# Altium footprint library capacitor_thd.PcbLib: 131 footprints (part 8 of 9)
Each footprint in its own frame and in the unit in brackets; x right, y up, seen from the top. Pads: shape width x height; smd on the part's side, far side on the other; paste and mask are expansions set on the pad; w line width, h text height; cw(c..) or ccw(c..) is an arc to the next point about the centre after c.
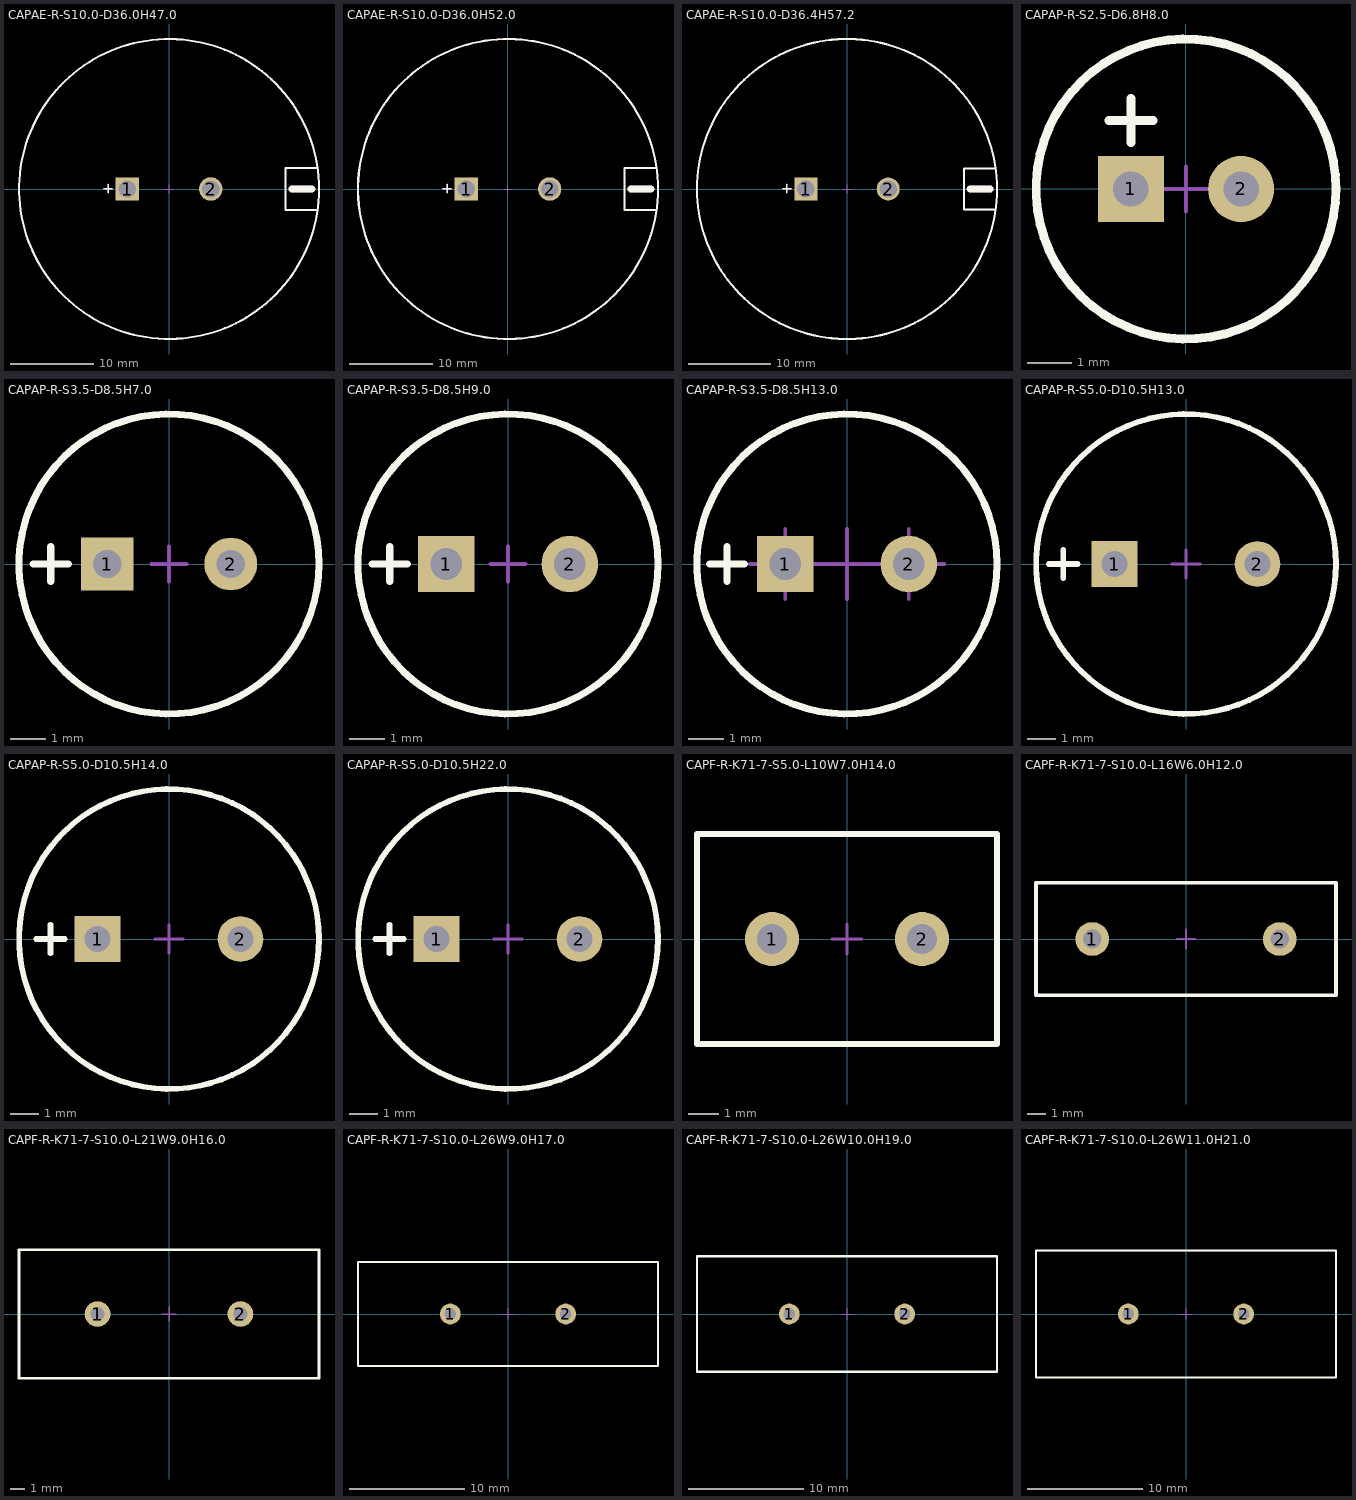
[diagram p7: the footprints below, top view; thin cyan lines are the x and y axes]

## CAPAE-R-S10.0-D36.0H47.0 [mm] "Capacitor, Radial, Leads spacing 10mm - Body Diameter 36.0mm X Body  Height 47.0mm"
height 47
pads (2):
  rect 2.8x2.8 hole 2.1: 1(-5,0)
  round 2.8 hole 2.1: 2(5,0)
Top Overlay:
  circle w0.254: c0,0 r18
  lines w0.2: -7.8,0.05 -6.8,0.05 ; -7.3,-0.45 -7.3,0.55
  lines w0.254: 17.75,-2.5 14,-2.5 14,2.5 17.75,2.5
  lines w0.8: 14.725,0 17.159,0
Mechanical 1:
  circle w0.1: c0,0 r18
  lines w0.1: -7.8,0.05 -6.8,0.05 ; -7.3,-0.45 -7.3,0.55 ; 17.75,-2.5 14,-2.5 14,2.5 17.75,2.5
  lines w0.8: 14.725,0 17.159,0
Mechanical 15:
  circle w0.1: c-0.01,0 r18
  lines w0.1: -0.5,0 0.5,0 ; 0,-0.5 0,0.5
3D body "CAPPR1000-3600X4700.stp": height 47, standoff -4, extent -18,-17.995 17.997,17.996

## CAPAE-R-S10.0-D36.0H52.0 [mm] "Capacitor, Radial, Leads spacing 10mm - Body Diameter 36.0mm X Body  Height 52.0mm"
height 52
pads (2):
  rect 2.8x2.8 hole 2.1: 1(-5,0)
  round 2.8 hole 2.1: 2(5,0)
Top Overlay:
  circle w0.254: c0,0 r18
  lines w0.2: -7.8,0.05 -6.8,0.05 ; -7.3,-0.45 -7.3,0.55
  lines w0.254: 17.75,-2.5 14,-2.5 14,2.5 17.75,2.5
  lines w0.8: 14.725,0 17.159,0
Mechanical 1:
  circle w0.1: c0,0 r18
  lines w0.1: -7.8,0.05 -6.8,0.05 ; -7.3,-0.45 -7.3,0.55 ; 17.75,-2.5 14,-2.5 14,2.5 17.75,2.5
  lines w0.8: 14.725,0 17.159,0
Mechanical 15:
  circle w0.1: c0,0 r18
  lines w0.1: -0.5,0 0.5,0 ; 0,-0.5 0,0.5
3D body "CAPPR1000-3600X5200.stp": height 52, standoff -4, extent -18,-17.958 18,17.958

## CAPAE-R-S10.0-D36.4H57.2 [mm] "Capacitor, Radial, Leads spacing 10mm - Body Diameter 36.4mm X Body  Height 57.2mm"
height 57.2
pads (2):
  rect 2.8x2.8 hole 2.1: 1(-5,0)
  round 2.8 hole 2.1: 2(5,0)
Top Overlay:
  circle w0.254: c0,0 r18.2
  lines w0.2: -7.8,0.05 -6.8,0.05 ; -7.3,-0.45 -7.3,0.55
  lines w0.254: 17.95,-2.5 14.2,-2.5 14.2,2.5 17.95,2.5
  lines w0.8: 14.925,0 17.359,0
Mechanical 1:
  circle w0.1: c0,0 r18.2
  lines w0.1: -7.8,0.05 -6.8,0.05 ; -7.3,-0.45 -7.3,0.55 ; 17.95,-2.5 14.2,-2.5 14.2,2.5 17.95,2.5
  lines w0.8: 14.925,0 17.359,0
Mechanical 15:
  circle w0.1: c0,0 r18.2
  lines w0.1: -0.5,0 0.5,0 ; 0,-0.5 0,0.5
3D body "CAPPR1000-3640X5720.stp": height 57.2, standoff -4, extent -18.2,-18.199 18.197,18.199

## CAPAP-R-S2.5-D6.8H8.0 [mm] "Capacitor, Radial, Pin spacing 2.5mm - Body Diameter 6.8mm X Body Height 7mm"
height 8
pads (2):
  rect 1.5x1.5 hole 0.8: 1(-1.25,0)
  round 1.5 hole 0.8: 2(1.25,0)
Top Overlay:
  circle w0.2: c0,0 r3.4
  lines w0.2: -1.75,1.55 -0.75,1.55 ; -1.25,1.05 -1.25,2.05
Mechanical 1:
  circle w0.1: c0,0 r3.4
  lines w0.1: -1.75,1.55 -0.75,1.55 ; -1.25,1.05 -1.25,2.05
Mechanical 15:
  circle w0.1: c0,0 r3.4
  lines w0.1: -0.5,0 0.5,0 ; 0,-0.5 0,0.5
3D body "CAPPR250-680X800.stp": height 8, standoff -3.6, extent -3.4,-3.4 3.4,3.4

## CAPAP-R-S3.5-D8.5H7.0 [mm] "Capacitor, Radial, Pin spacing 3.5mm - Body Diameter 8.5mm x Body Height 7.0mm"
height 7
pads (2):
  rect 1.5x1.5 hole 0.8: 1(-1.75,0)
  round 1.5 hole 0.8: 2(1.75,0)
Top Overlay:
  circle w0.2: c0,0 r4.25
  lines w0.2: -3.85,0 -2.85,0 ; -3.35,-0.5 -3.35,0.5
Mechanical 1:
  circle w0.1: c0,0 r4.25
  lines w0.1: -3.85,0 -2.85,0 ; -3.35,-0.5 -3.35,0.5
Mechanical 8:
  circle w0.1: c1.75,0 r0.225
  circle w0.1: c-1.75,0 r0.225
  lines w0.1: -1.975,0 -1.75,0 -1.75,-0.225 ; 1.525,0 1.75,0 1.75,-0.225
Mechanical 15:
  circle w0.1: c0,0 r4.25
  lines w0.1: -0.5,0 0.5,0 ; 0,-0.5 0,0.5
3D body "CAPPR350-850X700_a.stp": height 7, standoff -3.6, extent -4.25,-4.254 4.25,4.246

## CAPAP-R-S3.5-D8.5H9.0 [mm] "Capacitor, Radial, Pin spacing 3.5mm - Body Diameter 8.5mm x Body Height 9.0mm"
height 9
pads (2):
  rect 1.6x1.6 hole 0.9: 1(-1.75,0)
  round 1.6 hole 0.9: 2(1.75,0)
Top Overlay:
  circle w0.2: c0,0 r4.25
  lines w0.2: -3.85,0 -2.85,0 ; -3.35,-0.5 -3.35,0.5
Mechanical 1:
  circle w0.1: c0,0 r4.25
  lines w0.1: -3.85,0 -2.85,0 ; -3.35,-0.5 -3.35,0.5
Mechanical 8:
  circle w0.1: c-1.75,0 r0.225
  circle w0.1: c1.75,0 r0.225
  lines w0.1: -1.975,0 -1.75,0 -1.75,-0.225 ; 1.525,0 1.75,0 1.75,-0.225
Mechanical 15:
  circle w0.1: c0,0 r4.25
  lines w0.1: -0.5,0 0.5,0 ; 0,-0.5 0,0.5
3D body "CAPPR350-850X900.stp": height 9.5, standoff -3.6, extent -4.25,-4.25 4.25,4.25

## CAPAP-R-S3.5-D8.5H13.0 [mm] "Capacitor, Radial, Pin spacing 3.5mm - Body Diameter 8.5mm x Body Height 13mm"
height 13
pads (2):
  rect 1.6x1.6 hole 0.9: 1(-1.75,0)
  round 1.6 hole 0.9: 2(1.75,0)
Top Overlay:
  circle w0.2: c0,0 r4.25
  lines w0.2: -3.9,0 -2.9,0 ; -3.4,-0.5 -3.4,0.5
Mechanical 1:
  circle w0.1: c0,0 r4.25
  lines w0.1: -3.9,0 -2.9,0 ; -3.4,-0.5 -3.4,0.5
Mechanical 8:
  circle w0.1: c-1.75,0 r0.225
  circle w0.1: c1.75,0 r0.225
  lines w0.1: -2.75,0 -1.75,0 ; -1.975,0 -1.75,0 ; -1.75,-1 -1.75,0 ; -1.75,-0.225 -1.75,0 ; -1.75,1 -1.75,0 ; -1,0 0,0 ; -0.75,0 -1.75,0 ; 0,-1 0,0 ; 0,1 0,0 ; 0.75,0 1.75,0 ; 1,0 0,0 ; 1.525,0 1.75,0 ; 1.75,-1 1.75,0 ; 1.75,-0.225 1.75,0 ; 1.75,1 1.75,0 ; 2.75,0 1.75,0
Mechanical 15:
  circle w0.1: c0,0 r4.25
  lines w0.1: -0.5,0 0.5,0 ; 0,-0.5 0,0.5
3D body "CAPPR350-850X1300_a.stp": height 13, standoff -3.6, extent -4.25,-4.25 4.25,4.25

## CAPAP-R-S5.0-D10.5H13.0 [mm] "Capacitor, Radial, Pin spacing 5.0mm - Body Diameter 10.5mm (nom) X Body Height 13mm (max)"
height 13
pads (2):
  rect 1.6x1.6 hole 0.9: 1(-2.5,0)
  round 1.6 hole 0.9: 2(2.5,0)
Top Overlay:
  circle w0.2: c0,0 r5.25
  lines w0.2: -4.8,0 -3.8,0 ; -4.3,-0.5 -4.3,0.5
Mechanical 1:
  circle w0.1: c0,0 r5.25
  lines w0.1: -4.8,0 -3.8,0 ; -4.3,-0.5 -4.3,0.5
Mechanical 15:
  circle w0.1: c0,0 r5.25
  lines w0.1: -0.5,0 0.5,0 ; 0,-0.5 0,0.5
3D body "CAPPR500-1050X1300_a.stp": height 13, standoff -3.6, extent -5.25,-5.25 5.25,5.25

## CAPAP-R-S5.0-D10.5H14.0 [mm] "Capacitor, Radial, Pin spacing 5.0mm - Body Diameter 10.5mm X Body Height 14mm"
height 14
pads (2):
  rect 1.6x1.6 hole 0.9: 1(-2.5,0)
  round 1.6 hole 0.9: 2(2.5,0)
Top Overlay:
  circle w0.2: c0,0 r5.25
  lines w0.2: -4.65,0 -3.65,0 ; -4.15,-0.5 -4.15,0.5
Mechanical 1:
  circle w0.1: c0,0 r5.25
  lines w0.1: -4.65,0 -3.65,0 ; -4.15,-0.5 -4.15,0.5
Mechanical 15:
  circle w0.1: c0,0 r5.25
  lines w0.1: -0.5,0 0.5,0 ; 0,-0.5 0,0.5
3D body "CAPPR500-1050X1400_a.stp": height 14, standoff -3.6, extent -5.25,-5.233 5.25,5.233

## CAPAP-R-S5.0-D10.5H22.0 [mm] "Capacitor, Radial, Pin spacing 5.0mm - Body Diameter 10.5mm X Body Height 22mm"
height 22
pads (2):
  rect 1.6x1.6 hole 0.9: 1(-2.5,0)
  round 1.6 hole 0.9: 2(2.5,0)
Top Overlay:
  circle w0.2: c0,0 r5.25
  lines w0.2: -4.65,0 -3.65,0 ; -4.15,-0.5 -4.15,0.5
Mechanical 1:
  circle w0.1: c0,0 r5.25
  lines w0.1: -4.65,0 -3.65,0 ; -4.15,-0.5 -4.15,0.5
Mechanical 15:
  circle w0.1: c0,0 r5.25
  lines w0.1: -0.5,0 0.5,0 ; 0,-0.5 0,0.5
3D body "CAPPR500-1050X2200_a.stp": height 22, standoff -3.6, extent -5.25,-5.25 5.25,5.25

## CAPF-R-K71-7-S5.0-L10W7.0H14.0 [mm] "Capacitor K71-7, 1000-4000pF, 550pF, Radial, Pin spacing 5.0mm - Length 10.0mm Width 7.0mm Height 14.0mm"
height 14
pads (2):
  round 1.8 hole 1: 1(-2.5,0) 2(2.5,0)
Top Overlay:
  lines w0.2: -5,-3.5 -5,3.5 -2.5,3.5 2.5,3.5 5,3.5 5,-3.5 2.5,-3.5 -2.5,-3.5 -5,-3.5
Mechanical 1:
  lines w0.1: -5,-3.5 -5,3.5 5,3.5 5,-3.5 -5,-3.5
Mechanical 15:
  lines w0.1: -0.5,0 0.5,0 ; 0,-0.5 0,0.5 ; -5,-3.5 -5,3.5 5,3.5 5,-3.5 -5,-3.5
3D body "CAPF-R-K71-7-S5.0-L10W7.0H14.0.STEP": height 14, standoff -5, extent -5,-3.5 5,3.51

## CAPF-R-K71-7-S10.0-L16W6.0H12.0 [mm] "Capacitor K71-7, 4000pF - 0.014uF, Radial, Pin spacing 10.0mm - Length 16.0mm Width 6.0mm Height 12.0mm"
height 12
pads (2):
  round 1.8 hole 1: 1(-5,0) 2(5,0)
Top Overlay:
  lines w0.2: -8,-3 -8,3 -5,3 5,3 8,3 8,-3 5,-3 -5,-3 -8,-3
Mechanical 1:
  lines w0.1: -8,-3 -8,3 8,3 8,-3 -8,-3
Mechanical 15:
  lines w0.1: -0.5,0 0.5,0 ; 0,-0.5 0,0.5 ; -8,-3 8,-3 8,3 -8,3 -8,-3
3D body "CAPF-R-K71-7-S10.0-L16W6.0H12.0.STEP": height 12, standoff -5, extent -8,-3.01 8,3

## CAPF-R-K71-7-S10.0-L21W9.0H16.0 [mm] "Capacitor K71-7, 0.03 - 0.05uF, Radial, Pin spacing 10.0mm - Length 21.0mm Width 9.0mm Height 16.0mm"
height 16
pads (2):
  round 1.8 hole 1: 1(-5,0) 2(5,0)
Top Overlay:
  lines w0.2: -10.5,-4.5 -5,-4.5 5,-4.5 10.5,-4.5 10.5,4.5 5,4.5 -5,4.5 -10.5,4.5 -10.5,-4.5
Mechanical 1:
  lines w0.1: -10.5,-4.5 10.5,-4.5 10.5,4.5 -10.5,4.5 -10.5,-4.5
Mechanical 15:
  lines w0.1: -0.5,0 0.5,0 ; 0,-0.5 0,0.5 ; -10.5,-4.5 10.5,-4.5 10.5,4.5 -10.5,4.5 -10.5,-4.5
3D body "CAPF-R-K71-7-S10.0-L21W9.0H16.0.STEP": height 16, standoff -5, extent -10.5,-4.51 10.5,4.5

## CAPF-R-K71-7-S10.0-L26W9.0H17.0 [mm] "Capacitor K71-7, 0.05 - 0.10uF, Radial, Pin spacing 10.0mm - Length 26.0mm Width 9.0mm Height 17.0mm"
height 17
pads (2):
  round 1.8 hole 1: 1(-5,0) 2(5,0)
Top Overlay:
  lines w0.2: -13,-4.5 -13,4.5 -5,4.5 5,4.5 13,4.5 13,-4.5 5,-4.5 -5,-4.5 -13,-4.5
Mechanical 1:
  lines w0.1: -13,-4.5 13,-4.5 13,4.5 -13,4.5 -13,-4.5
Mechanical 15:
  lines w0.1: -0.5,0 0.5,0 ; 0,-0.5 0,0.5 ; -13,-4.5 -13,4.5 13,4.5 13,-4.5 -13,-4.5
3D body "CAPF-R-K71-7-S10.0-L26W9.0H17.0.STEP": height 17, standoff -5, extent -13,-4.51 13,4.5

## CAPF-R-K71-7-S10.0-L26W10.0H19.0 [mm] "Capacitor K71-7, 0.1 - 0.15uF, Radial, Pin spacing 10.0mm - Length 26.0mm Width 10.0mm Height 19.0mm"
height 19
pads (2):
  round 1.8 hole 1: 1(-5,0) 2(5,0)
Top Overlay:
  lines w0.2: -13,-5 -13,5 -5,5 5,5 13,5 13,-5 5,-5 -5,-5 -13,-5
Mechanical 1:
  lines w0.1: -13,-5 -13,5 13,5 13,-5 -13,-5
Mechanical 15:
  lines w0.1: -0.5,0 0.5,0 ; 0,-0.5 0,0.5 ; -13,-5 13,-5 13,5 -13,5 -13,-5
3D body "CAPF-R-K71-7-S10.0-L26W10.0H19.0.STEP": height 19, standoff -5, extent -13,-5.01 13,5

## CAPF-R-K71-7-S10.0-L26W11.0H21.0 [mm] "Capacitor K71-7, 0.15 - 0.20uF, Radial, Pin spacing 10.0mm - Length 26.0mm Width 11.0mm Height 21.0mm"
height 21
pads (2):
  round 1.8 hole 1: 1(-5,0) 2(5,0)
Top Overlay:
  lines w0.2: -13,-5.5 -5,-5.5 5,-5.5 13,-5.5 13,5.5 5,5.5 -5,5.5 -13,5.5 -13,-5.5
Mechanical 1:
  lines w0.1: -13,-5.5 13,-5.5 13,5.5 -13,5.5 -13,-5.5
Mechanical 15:
  lines w0.1: -0.5,0 0.5,0 ; 0,-0.5 0,0.5 ; -13,-5.5 13,-5.5 13,5.5 -13,5.5 -13,-5.5
3D body "CAPF-R-K71-7-S10.0-L26W11.0H21.0.STEP": height 21, standoff -5, extent -13,-5.51 13,5.5